# Altium footprint library 2.03-TO-系列封装.PcbLib: 76 footprints (part 3 of 5)
Each footprint in its own frame and in the unit in brackets; x right, y up, seen from the top. Pads: shape width x height; smd on the part's side, far side on the other; paste and mask are expansions set on the pad; w line width, h text height; cw(c..) or ccw(c..) is an arc to the next point about the centre after c.
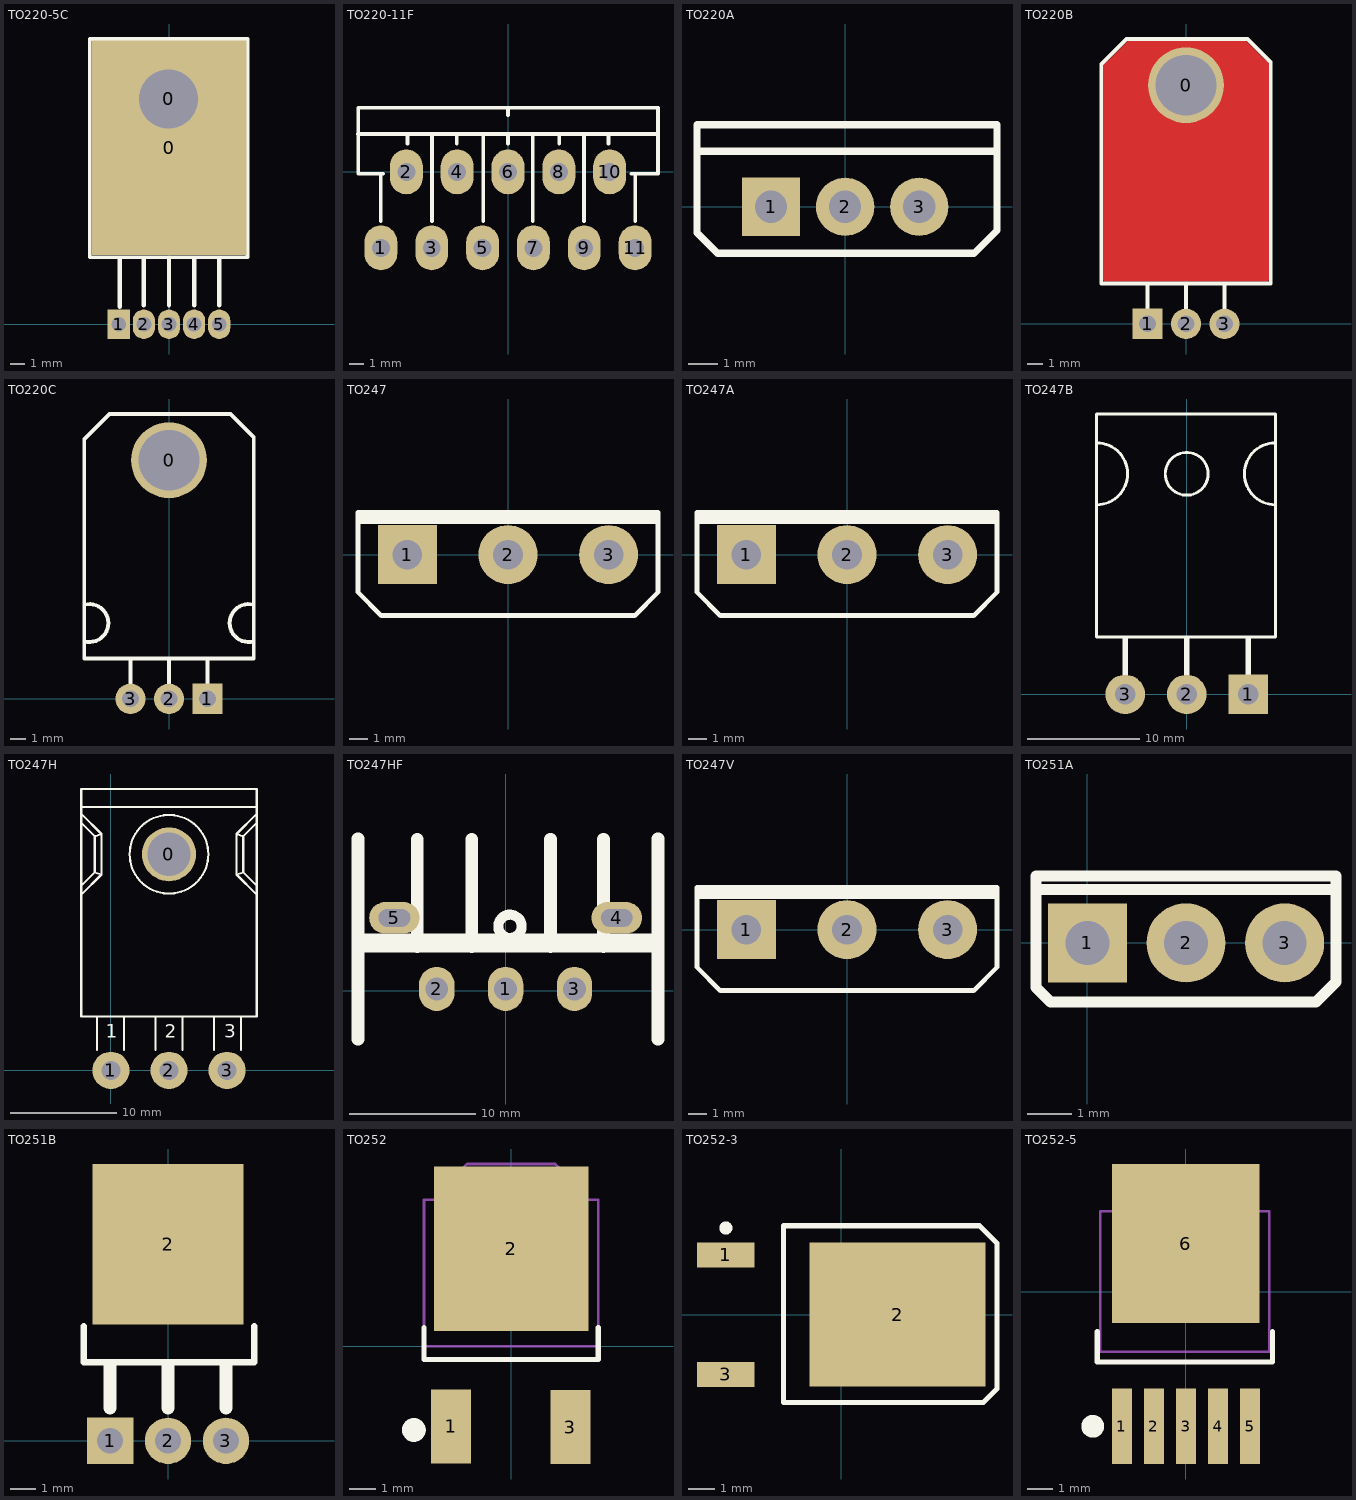
[diagram p2: the footprints below, top view; thin cyan lines are the x and y axes]

## TO220-5C [mm] "220，5脚晶体管"
pads (7):
  round 4.2 hole 4: 0(-0.022,15.247)
  rect 10.5x14.5 smd: 0(0,11.938)
  rect 1.5x2 hole 1: 1(-3.4,0)
  oval 1.5x2 hole 1: 2(-1.7,0) 3(0,0) 4(1.7,0) 5(3.4,0)
Top Overlay:
  lines w0.254: -5.356,4.528 -3.832,4.528 5.312,4.528 5.312,19.304 -5.356,19.304 -5.356,4.528
  lines w0.3: -3.324,1.194 -3.324,4.369 ; -1.7,1.27 -1.7,4.445 ; 0,1.27 0,4.445 ; 1.7,1.27 1.7,4.445 ; 3.4,1.27 3.4,4.445
3D body: height 2.5, standoff -5, extent -5.05,-0.225 5.05,18.1

## TO220-11F [mm] "TO22 11脚塑封"
pads (11):
  oval 2.2x3 hole 1.2: 1(-8.5,-5.08) 2(-6.8,0) 3(-5.1,-5.08) 4(-3.4,0) 5(-1.7,-5.08) 6(0,0) 7(1.7,-5.08) 8(3.4,0) 9(5.1,-5.08) 10(6.8,0) 11(8.5,-5.08)
Top Overlay:
  lines w0.254: -10.033,2.54 10.033,2.54 ; -8.509,-3.302 -8.509,-0.127 ; -8.359,-0.127 -10.01,-0.127 -10.01,4.29 10.01,4.29 10.033,4.29 10.033,-0.127 8.255,-0.127 ; -6.731,1.905 -6.731,2.54 ; -5.08,-3.302 -5.08,2.54 ; -3.429,1.905 -3.429,2.54 ; -1.651,-3.302 -1.651,2.54 ; 0,1.905 0,2.54 ; 0,3.81 0,4.29 ; 1.651,-3.302 1.651,2.54 ; 3.429,1.905 3.429,2.54 ; 5.08,-3.302 5.08,2.54 ; 6.731,1.905 6.731,2.54 ; 8.509,-3.302 8.509,-0.127
3D body: height 3.5, standoff -22.65, extent -10.01,-5.255 10.01,4.29

## TO220A [mm] "220，3脚晶体管                 联系卖家 免费查找封装"
pads (3):
  rect 2x2 hole 1.1: 1(-2.54,0)
  round 2 hole 1.1: 2(0,0) 3(2.54,0)
Top Overlay:
  lines w0.254: -4.928,1.905 5.131,1.905 ; -5.08,-0.889 -4.369,-1.6 4.42,-1.6 5.207,-0.813 5.207,2.819 -5.08,2.819 -5.08,-0.889
3D body: height 3.5, standoff -19, extent -5.15,-1.53 5.15,2.9

## TO220B [mm] "220，3脚晶体管                联系卖家 免费查找封装"
pads (4):
  round 5 hole 4: 0(0,15.748)
  rect 2x2 hole 1.1: 1(-2.54,0)
  round 2 hole 1.1: 2(0,0) 3(2.54,0)
Top Layer:
  rectangle: 3.81,17.526 4.445,18.034
  rectangle: 4.445,16.891 5.143,17.335
  rectangle: -4.826,17.018 -4.572,17.526
  rectangle: -4.318,17.653 -3.81,18.034
  rectangle: -4.572,16.891 -3.81,17.653
  rectangle: 4.064,16.891 4.699,17.78
  rectangle: -3.81,16.891 4.064,18.542
  rectangle: -5.334,2.921 5.334,17.018
  lines w0.254: -5.207,16.891 -3.81,18.288 ; -4.826,17.018 -3.81,18.034 ; 3.937,18.288 4.826,17.272 5.334,17.018 4.699,17.526 ; -5.334,2.921 -5.08,2.921 5.334,2.921 5.334,3.429 5.334,17.145 4.953,17.526 3.937,18.542 3.429,18.542 -3.81,18.542 -4.826,17.526 -5.334,17.018 -5.334,16.637 -5.334,2.921
Top Overlay:
  lines w0.254: -2.54,0.737 -2.54,2.667 ; 0,0.711 0,2.667 ; 2.54,0.686 2.54,2.667 ; -5.588,2.667 -5.588,17.145 -3.937,18.796 4.064,18.796 5.588,17.272 5.588,2.667 -5.588,2.667
3D body: height 4.43, standoff -3, extent -5.15,-0.25 5.15,18.5

## TO220C [mm] "220，3脚晶体管                 联系卖家 免费查找封装"
pads (4):
  round 5 hole 4: 0(0,15.748)
  rect 2x2 hole 1.1: 1(2.54,0)
  round 2 hole 1.1: 2(0,0) 3(-2.54,0)
Top Overlay:
  lines w0.254: -5.576,3.793 ccw(c-5.25,5) -5.576,6.207 ; -2.54,0.737 -2.54,2.667 ; 0,0.711 0,2.667 ; 2.54,0.686 2.54,2.667 ; 5.576,3.793 cw(c5.25,5) 5.576,6.207 ; -5.588,2.667 -5.588,17.145 -3.937,18.796 4.064,18.796 5.588,17.272 5.588,2.667 -5.588,2.667
3D body: height 4.5, standoff -3.43, extent -5.15,0 5.15,18.75

## TO247 [mm] "TO247，3脚立式封装                联系卖家 免费查找封装"
pads (3):
  rect 3.2x3.2 hole 1.6: 1(-5.45,0)
  round 3.2 hole 1.6: 2(0,0) 3(5.45,0)
Top Overlay:
  lines w0.254: -8.128,1.778 -8.128,2.032 ; -8.128,1.778 -8.128,-2.032 -6.858,-3.302 6.858,-3.302 8.128,-2.032 8.128,1.778 ; -8.128,1.778 8.128,1.778 ; -8.128,2.032 -8.128,2.286 8.128,2.286 8.128,1.778 ; -8.128,2.032 8.128,2.032 8.128,1.778
3D body: height 24, standoff -6, extent -7.75,-3 7.75,2

## TO247A [mm] "247，3脚立式封装                联系卖家 免费查找封装"
pads (3):
  rect 3.2x3.2 hole 1.6: 1(-5.45,0)
  round 3.2 hole 1.6: 2(0,0) 3(5.45,0)
Top Overlay:
  lines w0.254: -8.128,1.778 8.128,1.778 ; -8.128,1.778 -8.128,-2.032 -6.858,-3.302 6.858,-3.302 8.128,-2.032 8.128,1.778 ; -8.128,1.778 -8.128,2.032 ; -8.128,2.032 8.128,2.032 8.128,1.778 ; -8.128,2.032 -8.128,2.286 8.128,2.286 8.128,1.778
3D body: height 24, standoff -6, extent -7.75,-3 7.75,2

## TO247B [mm] "247，3脚卧式封装                联系卖家 免费查找封装"
pads (3):
  rect 3.5x3.5 hole 1.8: 1(5.461,0)
  round 3.5 hole 1.8: 2(0,0) 3(-5.461,0)
Top Overlay:
  circle w0.254: c0,19.58 r1.9
  lines w0.254: -8.001,16.83 ccw(c-8.001,19.58) -8.001,22.33 ; 7.874,16.83 cw(c7.874,19.58) 7.874,22.33 ; -8.001,5.08 -8.001,24.892 7.874,24.892 7.874,5.08 -8.001,5.08
  lines w0.508: -5.461,1.397 -5.461,4.953 ; 0,1.397 0,4.953 ; 5.461,1.397 5.461,4.953
3D body: height 3.49, standoff -5.51, extent -7.75,-0.35 7.75,25

## TO247H [mm] "联系卖家 免费查找封装"
pads (4):
  round 5.08 hole 4.064: 0(5.461,20.32)
  round 3.5 hole 1.8: 1(0,0) 2(5.461,0) 3(10.922,0)
Top Overlay:
  circle w0.2: c5.461,20.32 r3.698
  lines w0.2: -2.794,16.51 -0.889,18.415 ; -2.794,17.357 -1.524,18.627 ; -2.794,23.283 -1.524,22.013 ; -2.794,24.13 -0.889,22.225 ; -2.794,24.765 13.716,24.765 ; -1.312,1.905 -1.312,5.08 ; 1.228,1.905 1.228,5.08 ; 4.191,1.905 4.191,5.08 ; 6.731,1.905 6.731,5.08 ; 9.694,1.905 9.694,5.08 ; 12.234,1.905 12.234,5.08 ; 13.716,16.51 11.811,18.415 ; 13.716,17.357 12.446,18.627 ; 13.716,23.283 12.446,22.013 ; 13.716,24.13 11.811,22.225 ; -1.524,18.627 -0.889,18.415 ; -1.524,18.627 -1.524,22.013 ; -1.524,22.013 -0.889,22.225 ; -0.889,18.415 -0.889,22.225 ; 11.811,18.415 12.446,18.627 ; 11.811,18.415 11.811,22.225 ; 11.811,22.225 12.446,22.013 ; 12.446,18.627 12.446,22.013 ; -2.794,5.08 -2.794,26.458 13.716,26.458 13.716,5.08 -2.794,5.08
  text "3" at 10.668,3.048 h1.27
  text "2" at 5.08,3.048 h1.27
  text "1" at -0.508,3.048 h1.27
3D body: height 5, standoff -4, extent -2.289,-0.096 13.211,25.254

## TO247HF [mm] "联系卖家 免费查找封装"
pads (5):
  oval 2.8x3.5 hole 1.8: 1(0,0.127) 2(-5.45,0.127) 3(5.45,0.127)
  oval 4x2.5 hole 1.4 slot 2.5 at 0 deg: 4(8.8,5.75) 5(-8.8,5.75)
Top Overlay:
  circle w0.8: c0.345,5.08 r0.925
  lines w1: -11.684,-3.849 -11.684,12.006 ; -6.985,3.486 -6.985,11.986 ; -2.667,3.486 -2.667,11.986 ; 3.556,3.486 3.556,11.986 ; 7.747,3.486 7.747,11.986 ; 12.065,-3.849 12.065,12.006
  lines w1.5: -11.43,3.75 11.43,3.75
3D body: height 24, standoff -6, extent -7.75,-2.873 7.75,2.127

## TO247V [mm] "247，3脚立式封装                联系卖家 免费查找封装"
pads (3):
  rect 3.2x3.2 hole 1.6: 1(-5.45,0)
  round 3.2 hole 1.6: 2(0,0) 3(5.45,0)
Top Overlay:
  lines w0.254: -8.128,1.778 -8.128,2.032 ; -8.128,1.778 -8.128,-2.032 -6.858,-3.302 6.858,-3.302 8.128,-2.032 8.128,1.778 ; -8.128,1.778 8.128,1.778 ; -8.128,2.032 -8.128,2.286 8.128,2.286 8.128,1.778 ; -8.128,2.032 8.128,2.032 8.128,1.778
3D body: height 24, standoff -6, extent -7.75,-3 7.75,2

## TO251A [mm] "251，3脚晶体管                联系卖家 免费查找封装"
height 0.9
pads (3):
  rect 1.8x1.8 hole 1: 1(0,0)
  round 1.8 hole 1: 2(2.248,0) 3(4.496,0)
Top Overlay:
  lines w0.254: -1.168,1.219 5.639,1.219 ; -1.168,-1.016 -0.838,-1.346 5.207,-1.346 5.664,-0.889 5.664,1.524 -1.168,1.524 -1.168,-1.016
3D body: height 9.91, standoff -5, extent -1.052,-1.05 5.548,1.25

## TO251B [mm] "251，3脚晶体管                联系卖家 免费查找封装"
height 0.9
pads (4):
  rect 1.8x1.8 hole 1: 1(-2.248,0)
  round 1.8 hole 1: 2(0,0) 3(2.248,0)
  rect 5.842x6.223 smd: 2(0,7.62)
Top Overlay:
  lines w0.254: -3.264,4.445 -3.264,3.048 3.34,3.048 3.34,4.445
  lines w0.508: -2.248,1.27 -2.248,2.921 ; 0,1.27 0,2.921 ; 2.248,1.27 2.248,2.921
3D body: height 2.3, standoff -3, extent -3.3,-0.25 3.3,9.912

## TO252 [mil] "252晶体管                联系卖家 免费查找封装"
pads (3):
  rect 60x110 smd: 1(-89.55,-119.77) 3(88.45,-120.77)
  rect 230x245 smd: 2(0,145.35)
Top Overlay:
  circle w19.68: c-145,-125 r7.87
  lines w7.87: -130,27.56 -130,-20 130,-20 130,27.56
Mechanical 15:
  lines w3.94: -105.04,218.5 -105.04,236.06 -65.59,271.65 65.59,271.65 105.04,236.06 105.04,218.5 ; -130,0 130,0 130,218.5 -130,218.5 -130,0
3D body: height 98.31, standoff 3.82, extent -132.55,-155.08 132.56,242.56

## TO252-3 [mm] "D-PAK  / SOT-428                联系卖家 免费查找封装"
height 2.38
pads (3):
  rect 2.2x0.95 smd: 1(-4.4,2.28) 3(-4.4,-2.28)
  rect 6.7x5.5 smd: 2(2.15,0)
Top Overlay:
  circle w0.25: c-4.4,3.305 r0.125
  lines w0.1: -2.2,-3.35 -2.2,3.35
  lines w0.2: -2.2,-3.35 -2.2,3.391 5.278,3.391 5.944,2.725 5.944,-2.824 5.418,-3.35 -2.2,-3.35
3D body: height 2.5, standoff 0.1, extent -5.08,-3.367 5.02,3.367

## TO252-5 [mm] "TO252-5                联系卖家 免费查找封装"
pads (6):
  rect 0.8x3 smd: 1(-2.529,-5.328) 2(-1.259,-5.328) 3(0.011,-5.328) 4(1.281,-5.328) 5(2.551,-5.328)
  rect 5.842x6.3 smd: 6(0,1.905)
Top Overlay:
  circle w0.5: c-3.683,-5.334 r0.2
  lines w0.2: -3.504,-1.586 -3.504,-2.794 3.429,-2.794 3.429,-1.586
Mechanical 15:
  lines w0.1: -2.668,3.222 -2.668,3.668 -1.666,4.572 1.666,4.572 2.668,3.668 2.668,3.222 ; -3.377,-2.375 -3.377,3.175 3.302,3.175 3.302,-2.375 -3.377,-2.375
3D body: height 2.3, standoff 0, extent -3.35,-5.964 3.35,4.05